# Altium footprint library 691 321 300 0xx.PcbLib: 23 footprints (part 1 of 2)
Each footprint in its own frame and in the unit in brackets; x right, y up, seen from the top. Pads: shape width x height; smd on the part's side, far side on the other; paste and mask are expansions set on the pad; w line width, h text height; cw(c..) or ccw(c..) is an arc to the next point about the centre after c.
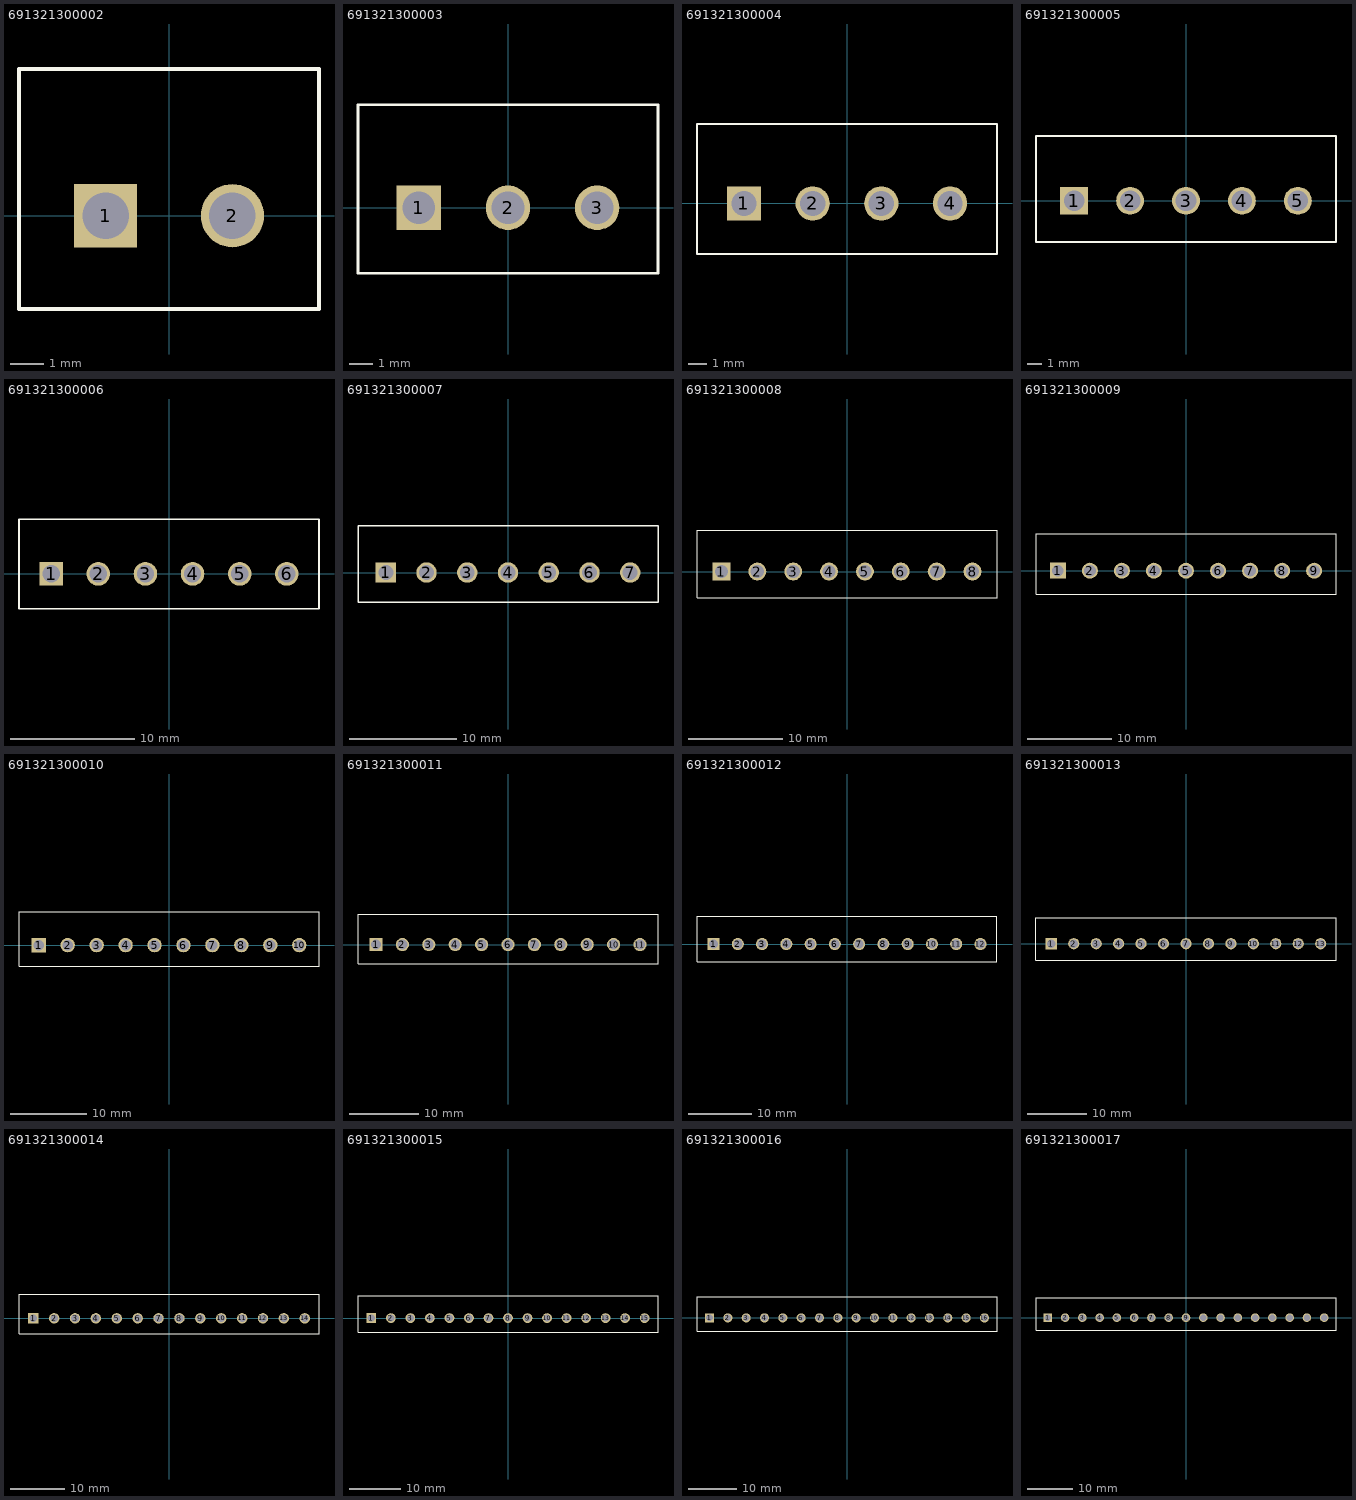
[diagram p0: the footprints below, top view; thin cyan lines are the x and y axes]

## 691321300002 [mm] "3,81mm - PCB Headers - Vertical - 02p"
height 9.2
pads (2):
  rect 1.9x1.9 hole 1.4: 1(-1.905,0)
  round 1.9 hole 1.4: 2(1.905,0)
Top Overlay:
  lines w0.127: -4.505,-2.8 -4.505,4.4 4.505,4.4 4.505,-2.8 -4.505,-2.8
3D body: height 9.21, standoff -3.49, extent -4.405,-2.8 4.405,4.4

## 691321300003 [mm] "3,81mm - PCB Headers - Vertical - 03p"
height 9.2
pads (3):
  rect 1.9x1.9 hole 1.4: 1(-3.81,0)
  round 1.9 hole 1.4: 2(0,0) 3(3.81,0)
Top Overlay:
  lines w0.127: -6.41,-2.8 6.41,-2.8 6.41,4.4 -6.41,4.4 -6.41,-2.8
3D body: height 9.21, standoff -3.49, extent -6.31,-2.8 6.31,4.4

## 691321300004 [mm] "3,81mm - PCB Headers - Vertical - 04p"
height 9.2
pads (4):
  rect 1.9x1.9 hole 1.4: 1(-5.715,0)
  round 1.9 hole 1.4: 2(-1.905,0) 3(1.905,0) 4(5.715,0)
Top Overlay:
  lines w0.127: -8.315,-2.8 8.315,-2.8 8.315,4.4 -8.315,4.4 -8.315,-2.8
3D body: height 9.21, standoff -3.49, extent -8.215,-2.8 8.215,4.4

## 691321300005 [mm] "3,81mm - PCB Headers - Vertical - 05p"
height 9.2
pads (5):
  rect 1.9x1.9 hole 1.4: 1(-7.62,0)
  round 1.9 hole 1.4: 2(-3.81,0) 3(0,0) 4(3.81,0) 5(7.62,0)
Top Overlay:
  lines w0.127: -10.22,-2.8 -10.22,4.4 10.22,4.4 10.22,-2.8 -10.22,-2.8
3D body: height 9.21, standoff -3.49, extent -10.12,-2.8 10.12,4.4

## 691321300006 [mm] "3,81mm - PCB Headers - Vertical - 06p"
height 9.2
pads (6):
  rect 1.9x1.9 hole 1.4: 1(-9.525,0)
  round 1.9 hole 1.4: 2(-5.715,0) 3(-1.905,0) 4(1.905,0) 5(5.715,0) 6(9.525,0)
Top Overlay:
  lines w0.127: -12.125,-2.8 12.125,-2.8 12.125,4.4 -12.125,4.4 -12.125,-2.8
3D body: height 9.21, standoff -3.49, extent -12.025,-2.8 12.025,4.4

## 691321300007 [mm] "3,81mm - PCB Headers - Vertical - 07p"
height 9.2
pads (7):
  rect 1.9x1.9 hole 1.4: 1(-11.43,0)
  round 1.9 hole 1.4: 2(-7.62,0) 3(-3.81,0) 4(0,0) 5(3.81,0) 6(7.62,0) 7(11.43,0)
Top Overlay:
  lines w0.127: -14.03,-2.8 -14.03,4.4 14.03,4.4 14.03,-2.8 -14.03,-2.8
3D body: height 9.21, standoff -3.49, extent -13.93,-2.8 13.93,4.4

## 691321300008 [mm] "3,81mm - PCB Headers - Vertical - 08p"
height 9.2
pads (8):
  rect 1.9x1.9 hole 1.4: 1(-13.335,0)
  round 1.9 hole 1.4: 2(-9.525,0) 3(-5.715,0) 4(-1.905,0) 5(1.905,0) 6(5.715,0) 7(9.525,0) 8(13.335,0)
Top Overlay:
  lines w0.127: -15.935,-2.8 15.935,-2.8 15.935,4.4 -15.935,4.4 -15.935,-2.8
3D body: height 9.21, standoff -3.49, extent -15.835,-2.8 15.835,4.4

## 691321300009 [mm] "3,81mm - PCB Headers - Vertical - 09p"
height 9.2
pads (9):
  rect 1.9x1.9 hole 1.4: 1(-15.24,0)
  round 1.9 hole 1.4: 2(-11.43,0) 3(-7.62,0) 4(-3.81,0) 5(0,0) 6(3.81,0) 7(7.62,0) 8(11.43,0) 9(15.24,0)
Top Overlay:
  lines w0.127: -17.84,-2.8 17.84,-2.8 17.84,4.4 -17.84,4.4 -17.84,-2.8
3D body: height 9.21, standoff -3.49, extent -17.74,-2.8 17.74,4.4

## 691321300010 [mm] "3,81mm - PCB Headers - Vertical - 10p"
height 9.2
pads (10):
  rect 1.9x1.9 hole 1.4: 1(-17.145,0)
  round 1.9 hole 1.4: 2(-13.335,0) 3(-9.525,0) 4(-5.715,0) 5(-1.905,0) 6(1.905,0) 7(5.715,0) 8(9.525,0) 9(13.335,0) 10(17.145,0)
Top Overlay:
  lines w0.127: -19.745,-2.8 -19.745,4.4 19.745,4.4 19.745,-2.8 -19.745,-2.8
3D body: height 9.21, standoff -3.49, extent -19.645,-2.8 19.645,4.4

## 691321300011 [mm] "3,81mm - PCB Headers - Vertical - 11p"
height 9.2
pads (11):
  rect 1.9x1.9 hole 1.4: 1(-19.05,0)
  round 1.9 hole 1.4: 2(-15.24,0) 3(-11.43,0) 4(-7.62,0) 5(-3.81,0) 6(0,0) 7(3.81,0) 8(7.62,0) 9(11.43,0) 10(15.24,0) 11(19.05,0)
Top Overlay:
  lines w0.127: -21.65,-2.8 -21.65,4.4 21.65,4.4 21.65,-2.8 -21.65,-2.8
3D body: height 9.21, standoff -3.49, extent -21.55,-2.8 21.55,4.4

## 691321300012 [mm] "3,81mm - PCB Headers - Vertical - 12p"
height 9.2
pads (12):
  rect 1.9x1.9 hole 1.4: 1(-20.955,0)
  round 1.9 hole 1.4: 2(-17.145,0) 3(-13.335,0) 4(-9.525,0) 5(-5.715,0) 6(-1.905,0) 7(1.905,0) 8(5.715,0) 9(9.525,0) 10(13.335,0) 11(17.145,0) 12(20.955,0)
Top Overlay:
  lines w0.127: -23.555,-2.8 -23.555,4.4 23.555,4.4 23.555,-2.8 -23.555,-2.8
3D body: height 9.21, standoff -3.49, extent -23.455,-2.8 23.455,4.4

## 691321300013 [mm] "3,81mm - PCB Headers - Vertical - 13p"
height 9.2
pads (13):
  rect 1.9x1.9 hole 1.4: 1(-22.86,0)
  round 1.9 hole 1.4: 2(-19.05,0) 3(-15.24,0) 4(-11.43,0) 5(-7.62,0) 6(-3.81,0) 7(0,0) 8(3.81,0) 9(7.62,0) 10(11.43,0) 11(15.24,0) 12(19.05,0) 13(22.86,0)
Top Overlay:
  lines w0.127: -25.46,-2.8 -25.46,4.4 25.46,4.4 25.46,-2.8 -25.46,-2.8
3D body: height 9.21, standoff -3.49, extent -25.36,-2.8 25.36,4.4

## 691321300014 [mm] "3,81mm - PCB Headers - Vertical - 14p"
height 9.2
pads (14):
  rect 1.9x1.9 hole 1.4: 1(-24.765,0)
  round 1.9 hole 1.4: 2(-20.955,0) 3(-17.145,0) 4(-13.335,0) 5(-9.525,0) 6(-5.715,0) 7(-1.905,0) 8(1.905,0) 9(5.715,0) 10(9.525,0) 11(13.335,0) 12(17.145,0) 13(20.955,0) 14(24.765,0)
Top Overlay:
  lines w0.127: -27.365,-2.8 -27.365,4.4 27.365,4.4 27.365,-2.8 -27.365,-2.8
3D body: height 9.21, standoff -3.49, extent -27.265,-2.8 27.265,4.4

## 691321300015 [mm] "3,81mm - PCB Headers - Vertical - 15p"
height 9.2
pads (15):
  rect 1.9x1.9 hole 1.4: 1(-26.67,0)
  round 1.9 hole 1.4: 2(-22.86,0) 3(-19.05,0) 4(-15.24,0) 5(-11.43,0) 6(-7.62,0) 7(-3.81,0) 8(0,0) 9(3.81,0) 10(7.62,0) 11(11.43,0) 12(15.24,0) 13(19.05,0) 14(22.86,0) 15(26.67,0)
Top Overlay:
  lines w0.127: -29.27,-2.8 29.27,-2.8 29.27,4.4 -29.27,4.4 -29.27,-2.8
3D body: height 9.21, standoff -3.49, extent -29.17,-2.8 29.17,4.4

## 691321300016 [mm] "3,81mm - PCB Headers - Vertical - 16p"
height 9.2
pads (16):
  rect 1.9x1.9 hole 1.4: 1(-28.575,0)
  round 1.9 hole 1.4: 2(-24.765,0) 3(-20.955,0) 4(-17.145,0) 5(-13.335,0) 6(-9.525,0) 7(-5.715,0) 8(-1.905,0) 9(1.905,0) 10(5.715,0) 11(9.525,0) 12(13.335,0) 13(17.145,0) 14(20.955,0) 15(24.765,0) 16(28.575,0)
Top Overlay:
  lines w0.127: -31.175,-2.8 -31.175,4.4 31.175,4.4 31.175,-2.8 -31.175,-2.8
3D body: height 9.21, standoff -3.49, extent -31.075,-2.8 31.075,4.4

## 691321300017 [mm] "3,81mm - PCB Headers - Vertical - 17p"
height 9.2
pads (17):
  rect 1.9x1.9 hole 1.4: 1(-30.48,0)
  round 1.9 hole 1.4: 2(-26.67,0) 3(-22.86,0) 4(-19.05,0) 5(-15.24,0) 6(-11.43,0) 7(-7.62,0) 8(-3.81,0) 9(0,0) 10(3.81,0) 11(7.62,0) 12(11.43,0) 13(15.24,0) 14(19.05,0) 15(22.86,0) 16(26.67,0) 17(30.48,0)
Top Overlay:
  lines w0.127: -33.08,-2.8 -33.08,4.4 33.08,4.4 33.08,-2.8 -33.08,-2.8
3D body: height 9.21, standoff -3.49, extent -32.98,-2.8 32.98,4.4